# Altium footprint library Cty1.PcbLib: 1378 footprints (part 46 of 87)
Each footprint in its own frame and in the unit in brackets; x right, y up, seen from the top. Pads: shape width x height; smd on the part's side, far side on the other; paste and mask are expansions set on the pad; w line width, h text height; cw(c..) or ccw(c..) is an arc to the next point about the centre after c.
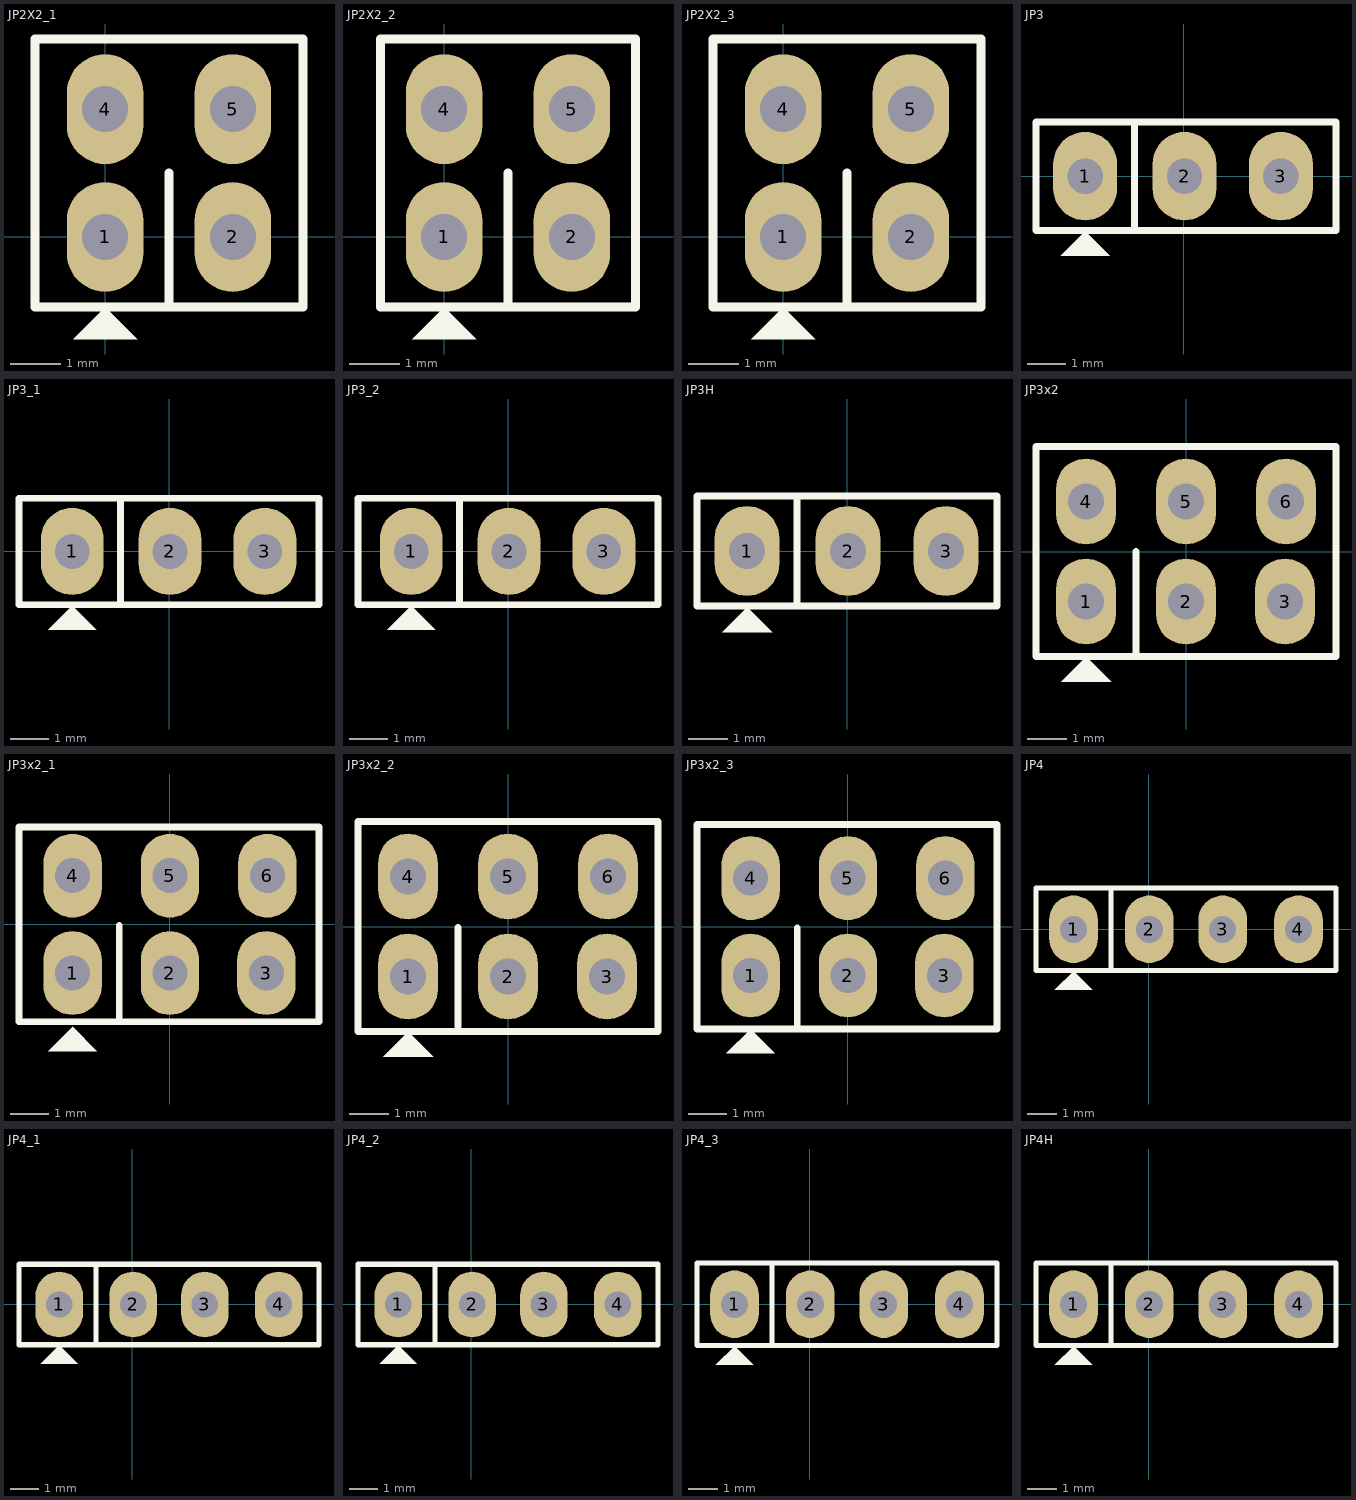
[diagram p45: the footprints below, top view; thin cyan lines are the x and y axes]

## JP2X2_1 [mil]
pads (4):
  oval 60x86 hole 36: 1(0,0) 2(100,0) 4(0,100) 5(100,100)
Top Overlay:
  region: 0,-55 -25,-80 25,-80
  lines w7: 50,-55 50,50 ; -55,-55 -55,155 155,155 155,-55 -55,-55
3D body "female_header_a-bl254-dg-g04d.stp": height 366.14, standoff -94.49, extent -55.12,-47.24 154.73,149.61

## JP2X2_2 [mil]
pads (4):
  oval 60x86 hole 36: 1(0,0) 2(100,0) 4(0,100) 5(100,100)
Top Overlay:
  region: 0,-55 -25,-80 25,-80
  lines w7: 50,-55 50,50 ; -50,-55 -50,50 -50,155 150,155 150,-55 -50,-55
3D body "pin_header_awl254-da-g04d.stp": height 216.54, standoff -98.43, extent -49.8,-12.01 150.2,495.08

## JP2X2_3 [mil]
pads (4):
  oval 60x86 hole 36: 1(0,0) 2(100,0) 4(0,100) 5(100,100)
Top Overlay:
  region: 0,-55 -25,-80 25,-80
  lines w7: 50,-55 50,50 ; -55,-55 155,-55 155,155 -55,155 -55,-55
3D body "female_header_a-bl254-da-g04d.stp": height 216.54, standoff -106.3, extent -55.12,-6.89 154.73,489.17

## JP3 [mil] "Jumper 3"
height 200
pads (3):
  oval 65x90 hole 36: 1(-100,0) 2(1,0) 3(99,0)
Top Overlay:
  region: -100,-56 -125,-81 -75,-81
  lines w7: -50,-55 -50,55 ; -150,-55 -150,55 155,55 155,-55 -150,-55
3D body "pin_header_aw140-eg-g03d.stp": height 354.33, standoff -86.61, extent -146.05,-49.04 153.94,49.32

## JP3_1 [mil] "Jumper 3"
height 200
pads (3):
  oval 65x90 hole 36: 1(-100,0) 2(1,0) 3(99,0)
Top Overlay:
  region: -100,-56 -125,-81 -75,-81
  lines w7: -50,-55 -50,55 ; -155,-55 155,-55 155,55 -155,55 -155,-55
3D body "female_header_a-bl254-eg-g03d.stp": height 366.14, standoff -94.49, extent -154.92,-46.26 154.92,52.17

## JP3_2 [mil] "Jumper 3"
height 200
pads (3):
  oval 65x90 hole 36: 1(-100,0) 2(1,0) 3(99,0)
Top Overlay:
  region: -100,-56 -125,-81 -75,-81
  lines w7: -50,-55 -50,55 ; -155,-55 155,-55 155,55 -155,55 -155,-55
3D body "female_header_a-bl254-ea-g03d.stp": height 108.27, standoff -116.14, extent -154.53,-5.9 155.32,390.16

## JP3H [mil] "Jumper 3"
height 200
pads (3):
  oval 65x90 hole 36: 1(-100,0) 2(1,0) 3(99,0)
Top Overlay:
  region: -100,-56 -125,-81 -75,-81
  lines w7: -50,-55 -50,55 ; -150,-55 -150,55 150,55 150,-55 -150,-55
3D body "pin_header_aw140-ea-g03g.stp": height 108.27, standoff -84.65, extent -145.67,-11.81 146.46,426.77

## JP3x2 [mil] "Connector 3x2"
height 200
pads (6):
  oval 60x86 hole 36: 1(-100,-50) 2(0,-50) 3(99,-50) 4(-100,50) 5(0,50) 6(100,50)
Top Overlay:
  region: -100,-105 -125,-130 -75,-130
  lines w7: -50,-105 -50,0 ; -150,-105 -150,0 -150,105 150,105 150,-105 -150,-105
3D body "JP2-3.stp": height 366.14, standoff -86.61, extent -149.99,-99.99 150.01,100.01

## JP3x2_1 [mil] "Connector 3x2"
height 200
pads (6):
  oval 60x86 hole 36: 1(-100,-50) 2(0,-50) 3(99,-50) 4(-100,50) 5(0,50) 6(100,50)
Top Overlay:
  region: -100,-105 -125,-130 -75,-130
  lines w7: -52,-100 -52,-1 ; -155,-100 153,-100 153,100 -155,100 -155,5 -155,-100
3D body "female_header_a-bl254-dg-g06d.stp": height 366.14, standoff -94.49, extent -153.54,-98.43 156.3,98.43

## JP3x2_2 [mil] "Connector 3x2"
height 200
pads (6):
  oval 60x86 hole 36: 1(-100,-50) 2(0,-50) 3(99,-50) 4(-100,50) 5(0,50) 6(100,50)
Top Overlay:
  region: -100,-105 -125,-130 -75,-130
  lines w7: -50,-100 -50,-1 ; -150,-105 -150,0 -150,105 150,105 150,-105 -150,-105
3D body "pin_header_awl254-da-g06d.stp": height 216.54, standoff -98.43, extent -150.59,-62.6 149.41,444.49

## JP3x2_3 [mil] "Connector 3x2"
height 200
pads (6):
  oval 60x86 hole 36: 1(-100,-50) 2(0,-50) 3(99,-50) 4(-100,50) 5(0,50) 6(100,50)
Top Overlay:
  region: -100,-105 -125,-130 -75,-130
  lines w7: -52,-100 -52,-1 ; -155,-105 -155,105 153,105 153,-105 -155,-105
3D body "female_header_a-bl254-da-g06d.stp": height 216.54, standoff -106.3, extent -154.53,-57.09 155.32,438.98

## JP4 [mil] "Jumper 4"
height 200
pads (4):
  oval 65x90 hole 36: 1(-100,0) 2(1,0) 3(99,0) 4(200,0)
Top Overlay:
  region: -100,-56 -125,-81 -75,-81
  lines w7: -50,-55 -50,55 ; -150,-55 -150,55 250,55 250,-55 -150,-55
3D body "JP4.stp": height 354.33, standoff -86.61, extent -148.03,-48.43 248.03,50

## JP4_1 [mil] "Jumper 4"
height 200
pads (4):
  oval 65x90 hole 36: 1(-100,0) 2(1,0) 3(99,0) 4(200,0)
Top Overlay:
  region: -100,-56 -125,-81 -75,-81
  lines w7: -50,-55 -50,55 ; -155,-55 -155,55 255,55 255,-55 -155,-55
3D body "female_header_a-bl254-eg-g04d.stp": height 366.14, standoff -94.49, extent -152.56,-48.23 257.28,50.2

## JP4_2 [mil] "Jumper 4"
height 200
pads (4):
  oval 65x90 hole 36: 1(-100,0) 2(1,0) 3(99,0) 4(200,0)
Top Overlay:
  region: -100,-56 -125,-81 -75,-81
  lines w7: -50,-55 -50,55 ; -155,-55 255,-55 255,55 -155,55 -155,-55
3D body "female_header_a-bl254-ea-g04d.stp": height 108.27, standoff -116.14, extent -154.72,-7.28 255.12,388.78

## JP4_3 [mil] "Jumper 4"
height 200
pads (4):
  oval 65x90 hole 36: 1(-100,0) 2(1,0) 3(99,0) 4(200,0)
Top Overlay:
  region: -100,-56 -125,-81 -75,-81
  lines w7: -50,-55 -50,55 ; -150,-55 250,-55 250,55 -150,55 -150,-55
3D body "jumper4_1.STEP": height 311.81, standoff -126.77, extent -145.67,-243.11 246.46,48.23

## JP4H [mil] "Jumper 4"
height 200
pads (4):
  oval 65x90 hole 36: 1(-100,0) 2(1,0) 3(99,0) 4(200,0)
Top Overlay:
  region: -100,-56 -125,-81 -75,-81
  lines w7: -50,-55 -50,55 ; -150,-55 250,-55 250,55 -150,55 -150,-55
3D body "pin_header_aw140-ea-g04g.stp": height 108.27, standoff -84.65, extent -146.65,-12.8 245.47,425.79